# Altium footprint library CRD25DA12N-FMC.PcbLib: 142 footprints (part 7 of 9)
Each footprint in its own frame and in the unit in brackets; x right, y up, seen from the top. Pads: shape width x height; smd on the part's side, far side on the other; paste and mask are expansions set on the pad; w line width, h text height; cw(c..) or ccw(c..) is an arc to the next point about the centre after c.
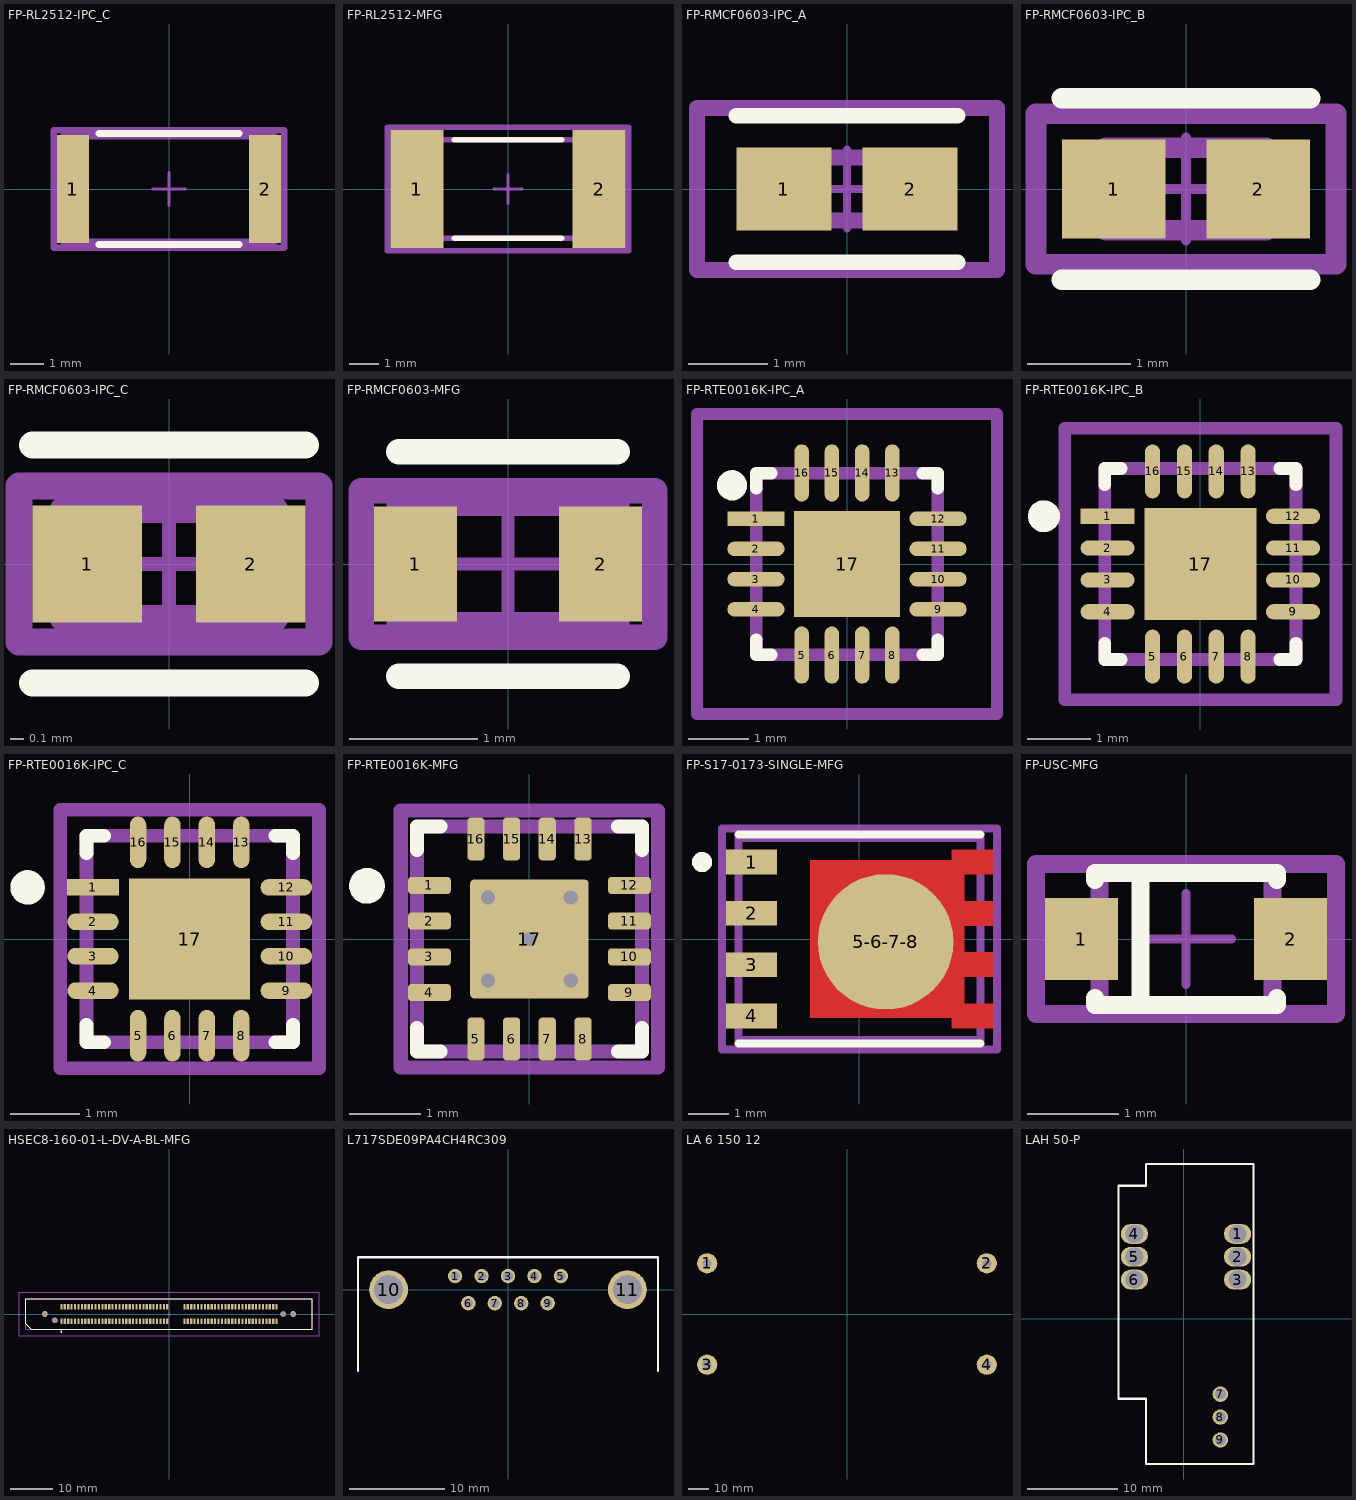
[diagram p6: the footprints below, top view; thin cyan lines are the x and y axes]

## FP-RL2512-IPC_C [mm]
pads (2):
  rect 0.958x3.258 smd paste+0 mask+0: 1(-2.902,0) 2(2.902,0)
Top Overlay:
  lines w0.2: -2.123,-1.675 2.123,-1.675 ; -2.123,1.675 2.123,1.675
Mechanical 5:
  lines w0.2: -3.481,-1.775 3.481,-1.775 3.481,1.775 -3.481,1.775 -3.481,-1.775
  text ".Designator" at 0,0.188 h1
Mechanical 13:
  lines w0.2: -3.175,-1.6 3.175,-1.6 3.175,1.6 -3.175,1.6 -3.175,-1.6
Mechanical 15:
  lines w0.2: -3.481,-1.775 3.481,-1.775 3.481,1.775 -3.481,1.775 -3.481,-1.775
Mechanical 16:
  lines w0.1: -0.5,0 0.5,0 ; 0,-0.5 0,0.5
3D body "Res_YAGEO_RL2512FK-070R1L_eec.STEP": height 0.25, standoff 0, extent -3.481,-1.775 3.481,1.775

## FP-RL2512-MFG [mm]
pads (2):
  rect 1.8x4 smd paste+0 mask+0: 1(-3.1,0) 2(3.1,0)
Top Overlay:
  lines w0.2: -1.825,-1.675 1.825,-1.675 ; -1.825,1.675 1.825,1.675
Mechanical 5:
  lines w0.2: -4.1,-2.1 4.1,-2.1 4.1,2.1 -4.1,2.1 -4.1,-2.1
  text ".Designator" at 0,0.188 h1
Mechanical 13:
  lines w0.2: -3.225,-1.675 3.225,-1.675 3.225,1.675 -3.225,1.675 -3.225,-1.675
Mechanical 15:
  lines w0.2: -4.1,-2.1 4.1,-2.1 4.1,2.1 -4.1,2.1 -4.1,-2.1
Mechanical 16:
  lines w0.1: -0.5,0 0.5,0 ; 0,-0.5 0,0.5
3D body "Res_YAGEO_RL2512FK-070R1L_eec.STEP": height 0.25, standoff 0, extent -4.1,-2.1 4.1,2.1

## FP-RMCF0603-IPC_A [mm]
pads (2):
  rect 1.206x1.058 smd paste+0 mask+0: 1(-0.801,0) 2(0.801,0)
Top Overlay:
  lines w0.2: -1.404,-0.929 1.404,-0.929 ; -1.404,0.929 1.404,0.929
Mechanical 5:
  lines w0.2: -1.904,-1.029 1.904,-1.029 1.904,1.029 -1.904,1.029 -1.904,-1.029
  text ".Designator" at 0,0.188 h1
Mechanical 13:
  lines w0.2: -0.775,-0.4 0.775,-0.4 0.775,0.4 -0.775,0.4 -0.775,-0.4
Mechanical 15:
  lines w0.2: -1.904,-1.029 1.904,-1.029 1.904,1.029 -1.904,1.029 -1.904,-1.029
Mechanical 16:
  lines w0.1: -0.5,0 0.5,0 ; 0,-0.5 0,0.5
3D body "Res_Stackpole_Electronics_RMCF0603JT1M80_eec.STEP": height 0.25, standoff 0, extent -1.904,-1.029 1.904,1.029

## FP-RMCF0603-IPC_B [mm]
pads (2):
  rect 1.006x0.958 smd paste+0 mask+0: 1(-0.701,0) 2(0.701,0)
Top Overlay:
  lines w0.2: -1.204,-0.879 1.204,-0.879 ; -1.204,0.879 1.204,0.879
Mechanical 5:
  lines w0.2: -1.454,-0.729 1.454,-0.729 1.454,0.729 -1.454,0.729 -1.454,-0.729
  text ".Designator" at 0,0.188 h1
Mechanical 13:
  lines w0.2: -0.775,-0.4 0.775,-0.4 0.775,0.4 -0.775,0.4 -0.775,-0.4
Mechanical 15:
  lines w0.2: -1.454,-0.729 1.454,-0.729 1.454,0.729 -1.454,0.729 -1.454,-0.729
Mechanical 16:
  lines w0.1: -0.5,0 0.5,0 ; 0,-0.5 0,0.5
3D body "Res_Stackpole_Electronics_RMCF0603JT1M80_eec.STEP": height 0.25, standoff 0, extent -1.454,-0.729 1.454,0.729

## FP-RMCF0603-IPC_C [mm]
pads (2):
  rect 0.806x0.858 smd paste+0 mask+0: 1(-0.601,0) 2(0.601,0)
Top Overlay:
  lines w0.2: -1.004,-0.875 1.004,-0.875 ; -1.004,0.875 1.004,0.875
Mechanical 5:
  lines w0.2: -1.104,-0.575 1.104,-0.575 1.104,0.575 -1.104,0.575 -1.104,-0.575
  text ".Designator" at 0,0.188 h1
Mechanical 13:
  lines w0.2: -0.775,-0.4 0.775,-0.4 0.775,0.4 -0.775,0.4 -0.775,-0.4
Mechanical 15:
  lines w0.2: -1.104,-0.575 1.104,-0.575 1.104,0.575 -1.104,0.575 -1.104,-0.575
Mechanical 16:
  lines w0.1: -0.5,0 0.5,0 ; 0,-0.5 0,0.5
3D body "Res_Stackpole_Electronics_RMCF0603JT1M80_eec.STEP": height 0.25, standoff 0, extent -1.104,-0.575 1.104,0.575

## FP-RMCF0603-MFG [mm]
pads (2):
  rect 0.65x0.9 smd paste+0 mask+0: 1(-0.725,0) 2(0.725,0)
Top Overlay:
  lines w0.2: -0.854,-0.879 0.854,-0.879 ; -0.854,0.879 0.854,0.879
Mechanical 5:
  lines w0.2: -1.15,-0.575 -1.15,0.575 1.15,0.575 1.15,-0.575 -1.15,-0.575
  text ".Designator" at 0,0.188 h1
Mechanical 13:
  lines w0.2: -0.85,-0.475 -0.85,0.475 0.85,0.475 0.85,-0.475 -0.85,-0.475
Mechanical 15:
  lines w0.2: -1.15,-0.575 -1.15,0.575 1.15,0.575 1.15,-0.575 -1.15,-0.575
Mechanical 16:
  lines w0.1: -0.5,0 0.5,0 ; 0,-0.5 0,0.5
3D body "Res_Stackpole_Electronics_RMCF0603JT1M80_eec.STEP": height 0.25, standoff 0, extent -1.15,-0.575 1.15,0.575

## FP-RTE0016K-IPC_A [mm]
pads (17):
  rect 0.949x0.239 smd paste+0 mask+0: 1(-1.505,0.75)
  rrect100% 0.949x0.239 smd paste+0 mask+0: 2(-1.505,0.25) 3(-1.505,-0.25) 4(-1.505,-0.75) 9(1.505,-0.75) 10(1.505,-0.25) 11(1.505,0.25) 12(1.505,0.75)
  rrect100% 0.239x0.949 smd paste+0 mask+0: 5(-0.75,-1.505) 6(-0.25,-1.505) 7(0.25,-1.505) 8(0.75,-1.505) 13(0.75,1.505) 14(0.25,1.505) 15(-0.25,1.505) 16(-0.75,1.505)
  rect 1.76x1.76 smd paste-1000 mask+0: 17(0,0)
Top Overlay:
  circle w0.25: c-1.9,1.3 r0.125
  lines w0.2: -1.5,-1.245 -1.5,-1.5 -1.245,-1.5 ; -1.5,1.245 -1.5,1.5 -1.245,1.5 ; 1.245,-1.5 1.5,-1.5 1.5,-1.245 ; 1.245,1.5 1.5,1.5 1.5,1.245
Top Paste:
  rectangle: -0.557,-0.557 0.557,0.557
Mechanical 5:
  lines w0.2: -2.479,-2.479 2.479,-2.479 2.479,2.479 -2.479,2.479 -2.479,-2.479
  text ".Designator" at 0,0.188 h1
Mechanical 13:
  lines w0.2: -1.5,-1.5 1.5,-1.5 1.5,1.5 -1.5,1.5 -1.5,-1.5
Mechanical 15:
  lines w0.2: -2.479,-2.479 2.479,-2.479 2.479,2.479 -2.479,2.479 -2.479,-2.479
Mechanical 16:
  lines w0.1: -0.5,0 0.5,0 ; 0,-0.5 0,0.5
3D body "IC_Texas_Instruments_LM51571QRTERQ1_eec.STEP": height 0.25, standoff 0, extent -2.479,-2.479 2.479,2.479

## FP-RTE0016K-IPC_B [mm]
pads (17):
  rect 0.849x0.239 smd paste+0 mask+0: 1(-1.455,0.75)
  rrect100% 0.849x0.239 smd paste+0 mask+0: 2(-1.455,0.25) 3(-1.455,-0.25) 4(-1.455,-0.75) 9(1.455,-0.75) 10(1.455,-0.25) 11(1.455,0.25) 12(1.455,0.75)
  rrect100% 0.239x0.849 smd paste+0 mask+0: 5(-0.75,-1.455) 6(-0.25,-1.455) 7(0.25,-1.455) 8(0.75,-1.455) 13(0.75,1.455) 14(0.25,1.455) 15(-0.25,1.455) 16(-0.75,1.455)
  rect 1.76x1.76 smd paste-1000 mask+0: 17(0,0)
Top Overlay:
  circle w0.25: c-2.454,0.75 r0.125
  lines w0.2: -1.5,-1.245 -1.5,-1.5 -1.245,-1.5 ; -1.5,1.245 -1.5,1.5 -1.245,1.5 ; 1.245,-1.5 1.5,-1.5 1.5,-1.245 ; 1.245,1.5 1.5,1.5 1.5,1.245
Top Paste:
  rectangle: -0.557,-0.557 0.557,0.557
Mechanical 5:
  lines w0.2: -2.129,-2.129 2.129,-2.129 2.129,2.129 -2.129,2.129 -2.129,-2.129
  text ".Designator" at 0,0.188 h1
Mechanical 13:
  lines w0.2: -1.5,-1.5 1.5,-1.5 1.5,1.5 -1.5,1.5 -1.5,-1.5
Mechanical 15:
  lines w0.2: -2.129,-2.129 2.129,-2.129 2.129,2.129 -2.129,2.129 -2.129,-2.129
Mechanical 16:
  lines w0.1: -0.5,0 0.5,0 ; 0,-0.5 0,0.5
3D body "IC_Texas_Instruments_LM51571QRTERQ1_eec.STEP": height 0.25, standoff 0, extent -2.129,-2.129 2.129,2.129

## FP-RTE0016K-IPC_C [mm]
pads (17):
  rect 0.749x0.239 smd paste+0 mask+0: 1(-1.405,0.75)
  rrect100% 0.749x0.239 smd paste+0 mask+0: 2(-1.405,0.25) 3(-1.405,-0.25) 4(-1.405,-0.75) 9(1.405,-0.75) 10(1.405,-0.25) 11(1.405,0.25) 12(1.405,0.75)
  rrect100% 0.239x0.749 smd paste+0 mask+0: 5(-0.75,-1.405) 6(-0.25,-1.405) 7(0.25,-1.405) 8(0.75,-1.405) 13(0.75,1.405) 14(0.25,1.405) 15(-0.25,1.405) 16(-0.75,1.405)
  rect 1.76x1.76 smd paste-1000 mask+0: 17(0,0)
Top Overlay:
  circle w0.25: c-2.354,0.75 r0.125
  lines w0.2: -1.5,-1.245 -1.5,-1.5 -1.245,-1.5 ; -1.5,1.245 -1.5,1.5 -1.245,1.5 ; 1.245,-1.5 1.5,-1.5 1.5,-1.245 ; 1.245,1.5 1.5,1.5 1.5,1.245
Top Paste:
  rectangle: -0.557,-0.557 0.557,0.557
Mechanical 5:
  lines w0.2: -1.879,-1.879 1.879,-1.879 1.879,1.879 -1.879,1.879 -1.879,-1.879
  text ".Designator" at 0,0.188 h1
Mechanical 13:
  lines w0.2: -1.5,-1.5 1.5,-1.5 1.5,1.5 -1.5,1.5 -1.5,-1.5
Mechanical 15:
  lines w0.2: -1.879,-1.879 1.879,-1.879 1.879,1.879 -1.879,1.879 -1.879,-1.879
Mechanical 16:
  lines w0.1: -0.5,0 0.5,0 ; 0,-0.5 0,0.5
3D body "IC_Texas_Instruments_LM51571QRTERQ1_eec.STEP": height 0.25, standoff 0, extent -1.879,-1.879 1.879,1.879

## FP-RTE0016K-MFG [mm]
pads (17):
  rrect42% 0.6x0.24 smd paste+0 mask+0: 1(-1.4,0.75) 2(-1.4,0.25) 3(-1.4,-0.25) 4(-1.4,-0.75) 9(1.4,-0.75) 10(1.4,-0.25) 11(1.4,0.25) 12(1.4,0.75)
  rrect42% 0.24x0.6 smd paste+0 mask+0: 5(-0.75,-1.4) 6(-0.25,-1.4) 7(0.25,-1.4) 8(0.75,-1.4) 13(0.75,1.4) 14(0.25,1.4) 15(-0.25,1.4) 16(-0.75,1.4)
  rrect6% 1.66x1.66 smd paste-1000 mask+0: 17(0,0)
via -0.58,0.58 diameter 0.5 hole 0.2
via 0.58,0.58 diameter 0.5 hole 0.2
via 0.58,-0.58 diameter 0.5 hole 0.2
via -0.58,-0.58 diameter 0.5 hole 0.2
via 0,0 diameter 0.5 hole 0.2
Top Overlay:
  circle w0.25: c-2.275,0.745 r0.125
  lines w0.2: -1.575,-1.245 -1.575,-1.575 -1.245,-1.575 ; -1.575,1.245 -1.575,1.575 -1.245,1.575 ; 1.245,-1.575 1.575,-1.575 1.575,-1.245 ; 1.245,1.575 1.575,1.575 1.575,1.245
Top Paste:
  region: -0.705,0.755 0.705,0.755 0.715,0.755 0.733,0.747 0.747,0.733 0.755,0.715 0.755,0.705 0.755,-0.705 0.755,-0.715 0.747,-0.733 0.733,-0.747 0.715,-0.755 0.705,-0.755 -0.705,-0.755 -0.715,-0.755 -0.733,-0.747 -0.747,-0.733 -0.755,-0.715 -0.755,-0.705 -0.755,0.705 -0.755,0.715 -0.747,0.733 -0.733,0.747 -0.715,0.755
Mechanical 5:
  lines w0.2: -1.8,-1.8 1.8,-1.8 1.8,1.8 -1.8,1.8 -1.8,-1.8
  text ".Designator" at 0,0.188 h1
Mechanical 13:
  lines w0.2: -1.575,-1.575 1.575,-1.575 1.575,1.575 -1.575,1.575 -1.575,-1.575
Mechanical 15:
  lines w0.2: -1.8,-1.8 1.8,-1.8 1.8,1.8 -1.8,1.8 -1.8,-1.8
Mechanical 16:
  lines w0.1: -0.5,0 0.5,0 ; 0,-0.5 0,0.5
3D body "IC_Texas_Instruments_XLM51571QRTERQ1_eec.STEP": height 0.25, standoff 0, extent -1.8,-1.8 1.8,1.8

## FP-S17-0173-SINGLE-MFG [mm]
pads (5):
  rect 1.27x0.61 smd paste+0 mask+0: 1(-2.67,1.905) 2(-2.67,0.635) 3(-2.67,-0.635) 4(-2.67,-1.905)
  round 3.356 smd paste+0 mask+0: 5-6-7-8(0.65,-0.069)
Top Layer:
  region: -1.215,1.955 2.285,1.955 2.285,2.21 3.305,2.21 3.305,1.6 2.595,1.6 2.595,0.94 3.305,0.94 3.305,0.33 2.595,0.33 2.595,-0.33 3.305,-0.33 3.305,-0.94 2.595,-0.94 2.595,-1.6 3.305,-1.6 3.305,-2.21 2.285,-2.21 2.285,-1.955 -1.215,-1.955
Top Overlay:
  circle w0.25: c-3.895,1.905 r0.125
  lines w0.2: -2.995,-2.585 2.995,-2.585 ; -2.995,2.585 2.995,2.585
Mechanical 5:
  lines w0.2: -3.405,-2.73 3.405,-2.73 3.405,2.73 -3.405,2.73 -3.405,-2.73
  text ".Designator" at 0,0.188 h1
Mechanical 13:
  lines w0.2: -2.995,-2.5 2.995,-2.5 2.995,2.5 -2.995,2.5 -2.995,-2.5
Mechanical 15:
  lines w0.2: -3.405,-2.73 3.405,-2.73 3.405,2.73 -3.405,2.73 -3.405,-2.73
Mechanical 16:
  lines w0.1: -0.5,0 0.5,0 ; 0,-0.5 0,0.5
3D body "Trans_Vishay_SI7461DP-T1-E3_eec.STEP": height 0.25, standoff 0, extent -3.405,-2.73 3.405,2.73

## FP-USC-MFG [mm]
pads (2):
  rect 0.8x0.9 smd paste+0 mask+0: 1(-1.15,0) 2(1.15,0)
Top Overlay:
  lines w0.2: -1,-0.65 -1,-0.725 1,-0.725 1,-0.65 ; -1,0.65 -1,0.725 1,0.725 1,0.65 ; -0.5,-0.725 -0.5,0.725
Mechanical 5:
  lines w0.2: -1.65,-0.825 -1.65,0.825 1.65,0.825 1.65,-0.825 -1.65,-0.825
  text ".Designator" at 0,0 h1
Mechanical 13:
  lines w0.2: -0.95,-0.725 -0.95,0.725 0.95,0.725 0.95,-0.725 -0.95,-0.725
Mechanical 15:
  lines w0.2: -1.65,-0.825 -1.65,0.825 1.65,0.825 1.65,-0.825 -1.65,-0.825
Mechanical 16:
  lines w0.1: -0.5,0 0.5,0 ; 0,-0.5 0,0.5
3D body "Diode_Toshiba_CUS520_H3F_eec.STEP": height 0.25, standoff 0, extent -1.65,-0.825 1.65,0.825

## HSEC8-160-01-L-DV-A-BL-MFG [mm]
pads (124):
  rect 0.5x1.2 smd paste+0 mask+0: 1(-25.2,-1.7) 2(-25.2,1.7) 3(-24.4,-1.7) 4(-24.4,1.7) 5(-23.6,-1.7) 6(-23.6,1.7) 7(-22.8,-1.7) 8(-22.8,1.7) 9(-22,-1.7) 10(-22,1.7) 11(-21.2,-1.7) 12(-21.2,1.7) 13(-20.4,-1.7) 14(-20.4,1.7) 15(-19.6,-1.7) 16(-19.6,1.7) 17(-18.8,-1.7) 18(-18.8,1.7) 19(-18,-1.7) 20(-18,1.7) 21(-17.2,-1.7) 22(-17.2,1.7) 23(-16.4,-1.7) 24(-16.4,1.7) 25(-15.6,-1.7) 26(-15.6,1.7) 27(-14.8,-1.7) 28(-14.8,1.7) 29(-14,-1.7) 30(-14,1.7) 31(-13.2,-1.7) 32(-13.2,1.7) 33(-12.4,-1.7) 34(-12.4,1.7) 35(-11.6,-1.7) 36(-11.6,1.7) 37(-10.8,-1.7) 38(-10.8,1.7) 39(-10,-1.7) 40(-10,1.7) 41(-9.2,-1.7) 42(-9.2,1.7) 43(-8.4,-1.7) 44(-8.4,1.7) 45(-7.6,-1.7) 46(-7.6,1.7) 47(-6.8,-1.7) 48(-6.8,1.7) 49(-6,-1.7) 50(-6,1.7) 51(-5.2,-1.7) 52(-5.2,1.7) 53(-4.4,-1.7) 54(-4.4,1.7) 55(-3.6,-1.7) 56(-3.6,1.7) 57(-2.8,-1.7) 58(-2.8,1.7) 59(-2,-1.7) 60(-2,1.7) 61(-1.2,-1.7) 62(-1.2,1.7) 63(-0.4,-1.7) 64(-0.4,1.7) 65(3.6,-1.7) 66(3.6,1.7) 67(4.4,-1.7) 68(4.4,1.7) 69(5.2,-1.7) 70(5.2,1.7) 71(6,-1.7) 72(6,1.7) 73(6.8,-1.7) 74(6.8,1.7) 75(7.6,-1.7) 76(7.6,1.7) 77(8.4,-1.7) 78(8.4,1.7) 79(9.2,-1.7) 80(9.2,1.7) 81(10,-1.7) 82(10,1.7) 83(10.8,-1.7) 84(10.8,1.7) 85(11.6,-1.7) 86(11.6,1.7) 87(12.4,-1.7) 88(12.4,1.7) 89(13.2,-1.7) 90(13.2,1.7) 91(14,-1.7) 92(14,1.7) 93(14.8,-1.7) 94(14.8,1.7) 95(15.6,-1.7) 96(15.6,1.7) 97(16.4,-1.7) 98(16.4,1.7) 99(17.2,-1.7) 100(17.2,1.7) 101(18,-1.7) 102(18,1.7) 103(18.8,-1.7) 104(18.8,1.7) 105(19.6,-1.7) 106(19.6,1.7) 107(20.4,-1.7) 108(20.4,1.7) 109(21.2,-1.7) 110(21.2,1.7) 111(22,-1.7) 112(22,1.7) 113(22.8,-1.7) 114(22.8,1.7) 115(23.6,-1.7) 116(23.6,1.7) 117(24.4,-1.7) 118(24.4,1.7) 119(25.2,-1.7) 120(25.2,1.7)
  round 1.34 hole 0.84 paste-2539.97 mask+0: 121(-29.05,0) 122(29.05,0)
  round 1.27 hole 1.27 unplated paste-2539.97 mask+0: ""(-26.7,-1.5) ""(26.7,0)
Top Overlay:
  circle w0.25: c-25.2,-4.125 r0.125
  lines w0.2: -33.55,-2.295 -32.28,-3.565 33.55,-3.565 33.55,3.565 -33.55,3.565 -33.55,-2.295
Top Paste:
  circle w1.27: c29.05,0 r0.635
  circle w1.27: c-29.05,0 r0.635
Mechanical 5:
  lines w0.2: -35.115,-5.09 -35.115,5.09 35.115,5.09 35.115,-5.09 -35.115,-5.09
  text ".Designator" at 0,0.188 h1
Mechanical 13:
  lines w0.2: -33.55,-3.565 -33.55,3.565 33.55,3.565 33.55,-3.565 -33.55,-3.565
Mechanical 15:
  lines w0.2: -35.115,-5.09 -35.115,5.09 35.115,5.09 35.115,-5.09 -35.115,-5.09
Mechanical 16:
  lines w0.1: -0.5,0 0.5,0 ; 0,-0.5 0,0.5
3D body "Conn_Samtec_HSEC8-160-01-L-DV-A-BL_eec.STEP": height 0.25, standoff 0, extent -35.115,-5.09 35.115,5.09

## L717SDE09PA4CH4RC309 [mm] "CONN D-SUB PLUG 9POS R/A SLDR"
height 12.55
pads (11):
  round 1.508 hole 1: 1(-5.54,1.42) 2(-2.77,1.42) 3(0,1.42) 4(2.77,1.42) 5(5.54,1.42) 6(-4.155,-1.42) 7(-1.385,-1.42) 8(1.385,-1.42) 9(4.155,-1.42)
  round 4.066 hole 3.05: 10(-12.495,0) 11(12.495,0)
Top Overlay:
  lines w0.254: -15.7,-8.5 -15.7,3.4 15.7,3.4 15.7,-8.5
3D body "Amphenol L717SDE09PA4CH4RC309 Color.STEP": height 12.55, standoff -3.2, extent -15.4,-15.6 15.405,3

## LA 6 150 12 [mm]
pads (4):
  round 10 hole 4.5: 1(-69,25) 2(69,25) 3(-69,-25) 4(69,-25)
3D body "Fischer Elektronik LA 6 150 + Fan.STEP": height 86.05, standoff 0.05, extent -104.53,-31.052 74.97,30.948

## LAH 50-P [mil]
pads (9):
  oval 118.74x86.61 hole 78.74 mask+7.87: 1(235,370) 2(235,270) 3(235,170) 5(-215,270) 6(-215,170)
  oval 118.74x86.61 hole 78.74 paste-99999 mask+7.87: 4(-215,370)
  round 67.24 hole 47.24: 7(160,-330) 8(160,-430) 9(160,-530)
Top Overlay:
  lines w10: -285,-350 -285,580 -165,580 -165,675 305,675 305,-635 -165,-635 -165,-350 -285,-350
3D body "LAH 50-P_blackbox.stp": height 789.5, standoff -182.94, extent -284.07,-636.02 304.07,675